# Altium footprint library PcbLib1.PcbLib: 102 footprints (part 2 of 7)
Each footprint in its own frame and in the unit in brackets; x right, y up, seen from the top. Pads: shape width x height; smd on the part's side, far side on the other; paste and mask are expansions set on the pad; w line width, h text height; cw(c..) or ccw(c..) is an arc to the next point about the centre after c.
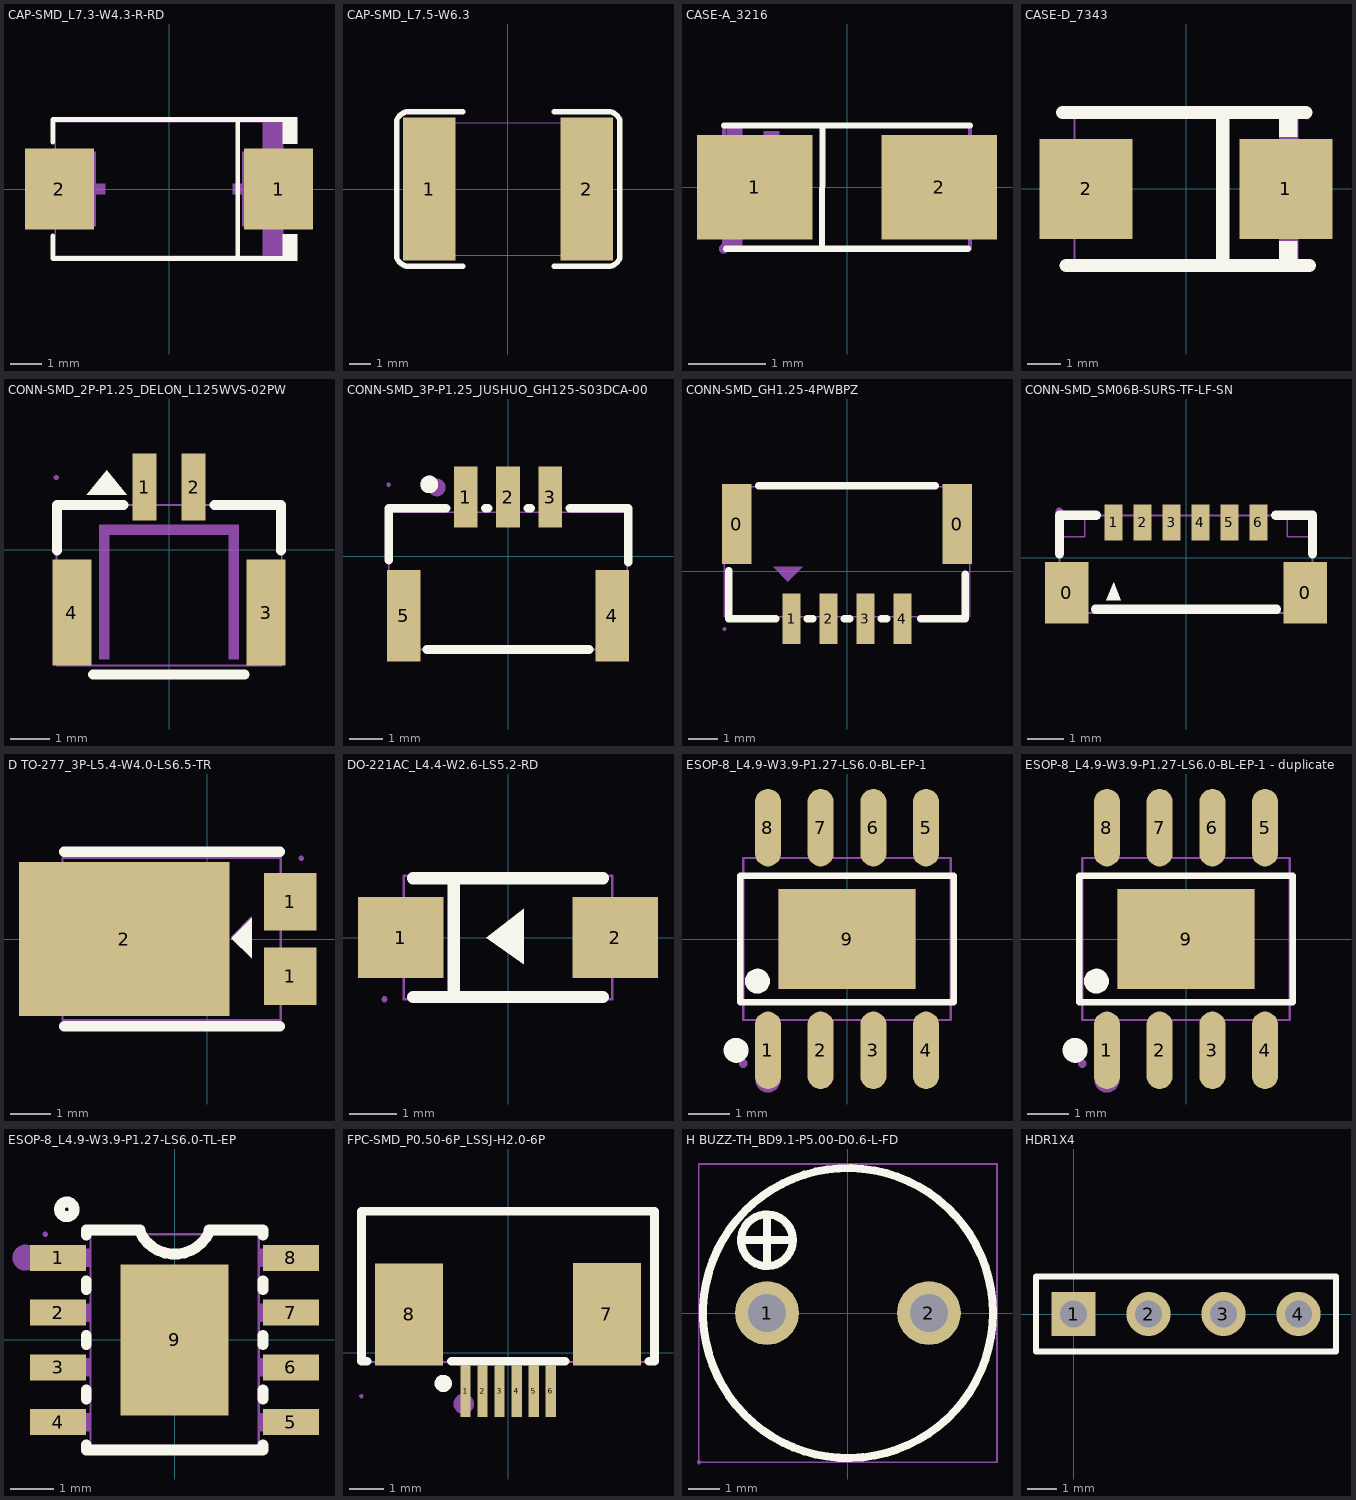
[diagram p1: the footprints below, top view; thin cyan lines are the x and y axes]

## CAP-SMD_L7.3-W4.3-R-RD [mm] "10uF ±10% 50V 坦电容"
pads (2):
  rect 2.207x2.592 smd: 1(3.511,0) 2(-3.511,0)
Top Overlay:
  region: 3.65,-2.302 3.65,-1.448 4.107,-1.448 4.107,-2.302
  region: 3.65,2.302 3.65,1.448 4.107,1.448 4.107,2.302
  lines w0.152: -3.726,-1.499 -3.726,-2.226 3.726,-2.226 ; -3.726,1.499 -3.726,2.226 3.726,2.226 ; 2.204,-2.226 2.204,2.226
Mechanical 6:
  region: 3.65,2.15 3.65,1.075 3.005,1.075 3.005,2.15
  region: 3.65,-2.15 3.65,-1.075 3.005,-1.075 3.005,-2.15
  region: 2.844,-1.075 2.844,1.075 2.521,1.075 2.521,-1.075
  region: 3.328,-0.161 3.328,0.161 2.038,0.161 2.038,-0.161
  region: -3.328,-0.161 -3.328,0.161 -2.038,0.161 -2.038,-0.161
Mechanical 15:
  region: 3.71,-2.12 3.71,-2.095 3.675,-2.06 3.625,-2.06 3.59,-2.095 3.59,-2.12 3.59,-2.145 3.625,-2.18 3.675,-2.18 3.71,-2.145
  region: 3.65,-1.2 3.65,1.2 2.35,1.2 2.35,-1.2
  region: -3.65,-1.2 -3.65,1.2 -2.35,1.2 -2.35,-1.2
  lines w0.051: -3.65,-2.15 3.65,-2.15 3.65,2.15 -3.65,2.15 -3.65,-2.15
3D body "CASE-D_7343666.STEP": height 4.21, standoff -0.04, extent -3.65,-2.15 3.65,2.15

## CAP-SMD_L7.5-W6.3 [mm] "22uF ±20% 50V"
pads (2):
  rect 2.5x6.8 smd: 1(-3.75,0) 2(3.75,0)
Top Overlay:
  lines w0.254: -2.159,-3.683 -4.826,-3.683 cw(c-4.699,-3.048) -5.3,-3.289 -5.3,3.289 cw(c-4.699,3.048) -4.826,3.683 -2.159,3.683 ; 2.193,-3.683 4.86,-3.683 ccw(c4.733,-3.048) 5.334,-3.289 5.334,3.289 ccw(c4.733,3.048) 4.86,3.683 2.193,3.683
Mechanical 15:
  region: 3.15,3.15 3.75,3.15 3.75,-3.15 3.15,-3.15
  region: -3.75,3.15 -3.15,3.15 -3.15,-3.15 -3.75,-3.15
  region: -3.69,-3.15 -3.69,-3.125 -3.725,-3.09 -3.775,-3.09 -3.81,-3.125 -3.81,-3.15 -3.81,-3.175 -3.775,-3.21 -3.725,-3.21 -3.69,-3.175
  lines w0.051: -3.75,-3.15 3.75,-3.15 3.75,3.15 -3.75,3.15 -3.75,-3.15

## CASE-A_3216 [mm]
pads (2):
  rect 1.5x1.359 smd: 1(-1.2,0) 2(1.2,0)
Top Overlay:
  lines w0.08: -1.6,0.8 1.6,0.8 ; -1.575,-0.8 1.575,-0.8 ; -0.323,-0.8 -0.32,0.8
Mechanical 6:
  region: -1.081,0.724 -0.878,0.724 -0.878,-0.673 -1.081,-0.673
  region: -0.61,0.13 -0.61,-0.08 -1.45,-0.08 -1.45,0.13
  region: -1.363,-0.813 -1.567,-0.813 -1.567,-0.483 -1.363,-0.483
  region: -1.563,0.813 -1.36,0.813 -1.36,0.483 -1.563,0.483
  region: 1.501,0.13 1.501,-0.08 0.661,-0.08 0.661,0.13
Mechanical 15:
  region: 1.6,0.625 1.6,-0.575 0.8,-0.575 0.8,0.625
  region: -0.8,0.625 -0.8,-0.575 -1.6,-0.575 -1.6,0.625
  region: -1.54,-0.8 -1.54,-0.775 -1.575,-0.74 -1.625,-0.74 -1.66,-0.775 -1.66,-0.8 -1.66,-0.825 -1.625,-0.86 -1.575,-0.86 -1.54,-0.825
  lines w0.051: -1.6,-0.8 -1.6,0.8 1.6,0.8 1.6,-0.8 -1.6,-0.8
3D body "CASE-A-3216.STEP": height 1.69, standoff -0.01, extent -1.6,-0.8 1.6,0.8

## CASE-D_7343 [mm] "10uf坦电容"
pads (2):
  rect 2.799x3.01 smd: 1(3,0) 2(-3,0)
Top Overlay:
  region: 2.798,2.3 2.798,1.565 3.348,1.565 3.348,2.285 3.333,2.3 3.178,2.3
  region: 3.348,-2.3 3.348,-1.565 2.798,-1.565 2.798,-2.285 2.813,-2.3 2.968,-2.3
  lines w0.4: -3.7,2.3 3.6,2.3 ; -3.6,-2.3 3.7,-2.3 ; 1.1,-2.3 1.101,2.3
Mechanical 6:
  region: -3.6,0.2 -1.9,0.2 -1.9,-0.2 -3.6,-0.2
  region: 1.766,0.245 3.466,0.245 3.466,-0.155 1.766,-0.155
  region: 2.8,0.85 2.8,-0.85 2.4,-0.85 2.4,0.85
  region: 2.8,2.15 2.8,1.205 3.35,1.205 3.35,2.15
  region: 3.35,-2.15 3.35,-1.205 2.8,-1.205 2.8,-2.15
Mechanical 15:
  region: -2.35,-1.2 -3.65,-1.2 -3.65,1.2 -2.35,1.2
  region: 3.65,-1.2 2.35,-1.2 2.35,1.2 3.65,1.2
  region: 3.71,2.15 3.71,2.175 3.675,2.21 3.625,2.21 3.59,2.175 3.59,2.15 3.59,2.125 3.625,2.09 3.675,2.09 3.71,2.125
  lines w0.051: -3.35,-2.15 -3.35,2.15 3.35,2.15 3.35,-2.15 -3.35,-2.15
3D body "CASE-D_7343666.STEP": height 4.21, standoff -0.04, extent -3.655,-2.137 3.645,2.163

## CONN-SMD_2P-P1.25_DELON_L125WVS-02PW [mm]
pads (4):
  rect 0.6x1.7 smd paste+0 mask+0.05: 1(-0.625,1.6) 2(0.625,1.6)
  rect 1x2.7 smd paste+0 mask+0.05: 3(2.475,-1.6) 4(-2.475,-1.6)
Top Overlay:
  region: -1.584,2.032 -2.092,1.397 -1.076,1.397
  lines w0.254: -2.854,-0.019 -2.854,1.143 -1.156,1.143 ; -1.932,-3.175 1.932,-3.175 ; 1.156,1.143 2.854,1.143 2.854,-0.019
Mechanical 6:
  region: 1.524,0.635 -1.524,0.635 -1.524,0.381 1.524,0.381
  region: 1.778,-2.794 1.778,0.635 1.524,0.635 1.524,-2.794
  region: -1.778,-2.794 -1.778,0.635 -1.524,0.635 -1.524,-2.794
Mechanical 15:
  region: 2.365,-0.6 2.585,-0.6 2.585,-2.6 2.365,-2.6
  region: -2.585,-0.6 -2.365,-0.6 -2.365,-2.6 -2.585,-2.6
  region: 0.525,1.843 0.725,1.843 0.725,1.043 0.525,1.043
  region: -0.725,1.843 -0.525,1.843 -0.525,1.043 -0.725,1.043
  region: -2.815,1.843 -2.815,1.868 -2.85,1.903 -2.9,1.903 -2.935,1.868 -2.935,1.843 -2.935,1.818 -2.9,1.783 -2.85,1.783 -2.815,1.818
  lines w0.051: -2.875,-2.957 2.875,-2.957 2.875,1.143 -2.875,1.143 -2.875,-2.957
3D body "SMD,P=1.25mm1.STEP": height 4.29, standoff -0.07, extent -2.875,-3.034 2.875,1.966

## CONN-SMD_3P-P1.25_JUSHUO_GH125-S03DCA-00 [mm]
pads (5):
  rect 0.7x1.8 smd paste+0 mask+0.05: 1(-1.25,1.75) 2(0,1.75) 3(1.25,1.75)
  rect 1x2.7 smd paste+0 mask+0.05: 4(3.08,-1.75) 5(-3.08,-1.75)
Top Overlay:
  circle w0.26: c-2.325,2.125 r0.13
  lines w0.254: -3.525,-0.119 -3.525,1.425 -1.831,1.425 ; -2.4,-2.75 2.4,-2.75 ; -0.669,1.425 -0.581,1.425 ; 0.581,1.425 0.669,1.425 ; 1.831,1.425 3.556,1.425 3.556,-0.169
Mechanical 6:
  circle w0.26: c-2.325,2.125 r0.13
  circle w0.26: c-2.105,2.035 r0.13
Mechanical 15:
  region: -3.465,2.12 -3.465,2.145 -3.5,2.18 -3.55,2.18 -3.585,2.145 -3.585,2.12 -3.585,2.095 -3.55,2.06 -3.5,2.06 -3.465,2.095
  region: 1.15,2.12 1.35,2.12 1.35,1.12 1.15,1.12
  region: -0.1,2.12 0.1,2.12 0.1,1.12 -0.1,1.12
  region: -1.35,2.12 -1.15,2.12 -1.15,1.12 -1.35,1.12
  region: 2.98,-0.83 3.18,-0.83 3.18,-2.67 2.98,-2.67
  region: -3.18,-0.83 -2.98,-0.83 -2.98,-2.67 -3.18,-2.67
  lines w0.051: -3.525,-2.75 -3.525,1.3 3.525,1.3 3.525,-2.75 -3.525,-2.75
3D body "SMD,P=1.25mm.STEP": height 4.29, standoff 0.04, extent -3.525,-2.425 3.526,2.425

## CONN-SMD_GH1.25-4PWBPZ [mm]
pads (6):
  rect 1x2.7 smd paste+0 mask+0.05: 0(-3.725,1.601) 0(3.725,1.601)
  rect 0.6x1.7 smd paste+0 mask+0.05: 1(-1.875,-1.601) 2(-0.625,-1.601) 3(0.625,-1.601) 4(1.875,-1.601)
Top Overlay:
  lines w0.254: -4,0.02 -4,-1.601 -2.5,-1.601 -2.406,-1.601 ; -2.994,2.899 2.994,2.899 ; -1.344,-1.601 -1.156,-1.601 ; -0.094,-1.601 0.094,-1.601 ; 1.156,-1.601 1.344,-1.601 ; 2.5,-1.601 4,-1.601 4,-0.101
Mechanical 6:
  region: -1.5,0.149 -2.5,0.149 -2,-0.351
Mechanical 15:
  region: 3.625,2.851 3.825,2.851 3.825,0.351 3.625,0.351
  region: -3.825,2.851 -3.625,2.851 -3.625,0.351 -3.825,0.351
  region: 1.775,-0.943 1.975,-0.943 1.975,-1.943 1.775,-1.943
  region: 0.525,-0.943 0.725,-0.943 0.725,-1.943 0.525,-1.943
  region: -0.725,-0.943 -0.525,-0.943 -0.525,-1.943 -0.725,-1.943
  region: -1.975,-0.943 -1.775,-0.943 -1.775,-1.943 -1.975,-1.943
  region: -4.09,-1.943 -4.09,-1.918 -4.125,-1.883 -4.175,-1.883 -4.21,-1.918 -4.21,-1.943 -4.21,-1.968 -4.175,-2.003 -4.125,-2.003 -4.09,-1.968
  lines w0.051: -4.15,-1.537 4.15,-1.537 4.15,2.863 -4.15,2.863 -4.15,-1.537
3D body "-.STEP": height 4.25, standoff -0.01, extent -4.096,-1.94 4.155,2.92

## CONN-SMD_SM06B-SURS-TF-LF-SN [mm]
pads (8):
  rect 1.2x1.7 smd: 0(-3.3,-0.975) 0(3.3,-0.975)
  rect 0.5x1 smd: 1(-2,0.975) 2(-1.2,0.975) 3(-0.4,0.975) 4(0.4,0.975) 5(1.2,0.975) 6(2,0.975)
Top Overlay:
  region: -2.2,-1.175 -1.8,-1.175 -2,-0.675
  lines w0.254: -3.5,0.106 -3.5,1.175 -2.481,1.175 ; -2.5,-1.425 2.5,-1.425 ; 2.481,1.175 3.5,1.175 3.5,0.106
Mechanical 15:
  region: -3.4,1.275 -3.4,1.316 -3.459,1.375 -3.541,1.375 -3.6,1.316 -3.6,1.275 -3.6,1.234 -3.541,1.175 -3.459,1.175 -3.4,1.234
  region: 1.9,1.275 2.1,1.275 2.1,0.675 1.9,0.675
  region: 1.1,1.275 1.3,1.275 1.3,0.675 1.1,0.675
  region: 0.3,1.275 0.5,1.275 0.5,0.675 0.3,0.675
  region: -0.5,1.275 -0.3,1.275 -0.3,0.675 -0.5,0.675
  region: -1.3,1.275 -1.1,1.275 -1.1,0.675 -1.3,0.675
  region: -2.1,1.275 -1.9,1.275 -1.9,0.675 -2.1,0.675
  region: 3.3,-0.53 3.5,-0.53 3.5,-1.53 3.3,-1.53
  region: -3.3,-1.53 -3.5,-1.53 -3.5,-0.53 -3.3,-0.53
  lines w0.051: -3.5,-1.53 3.5,-1.53 3.5,0.58 2.8,0.58 2.8,1.17 -2.8,1.17 -2.8,0.58 -3.5,0.58 -3.5,-1.53

## D TO-277_3P-L5.4-W4.0-LS6.5-TR [mm]
pads (3):
  rect 1.29x1.422 smd mask+0.051: 1(2.054,-0.92) 1(2.054,0.92)
  rect 5.2x3.8 smd mask+0.051: 2(-2.054,0)
Top Overlay:
  region: 0.599,0.02 1.099,0.52 1.099,-0.48
  lines w0.254: -3.537,-2.159 1.797,-2.159 ; -3.537,2.159 1.797,2.159
Mechanical 6:
  region: 0.589,0.06 1.089,0.56 1.089,-0.44
Mechanical 15:
  region: 2.387,2 2.387,2.025 2.352,2.06 2.302,2.06 2.267,2.025 2.267,2 2.267,1.975 2.302,1.94 2.352,1.94 2.387,1.975 2.387,2
  region: -3.401,-0.86 -4.221,-0.86 -4.221,0.94 -3.401,0.94 -3.401,1.6 0.179,1.6 0.179,-1.48 -3.401,-1.48
  region: 1.777,-0.47 2.327,-0.47 2.327,-1.37 1.777,-1.37
  region: 1.777,1.37 2.327,1.37 2.327,0.47 1.777,0.47
  lines w0.051: -3.581,-2 -3.581,2 1.819,2 1.819,-2 -3.581,-2
3D body "TO-277B.STEP": height 1.2, standoff 0, extent -4.445,-2.375 2.305,2.375

## DO-221AC_L4.4-W2.6-LS5.2-RD [mm]
pads (2):
  rect 1.8x1.7 smd: 1(-2.26,0) 2(2.26,0)
Top Overlay:
  region: -0.457,0 0.33,0.61 0.33,-0.559
  lines w0.254: -1.999,-1.25 1.999,-1.25 ; -1.999,1.25 1.999,1.25 ; -1.143,-1.245 -1.143,1.245
Mechanical 6:
  region: -2.667,0.152 -1.803,0.152 -1.803,-0.102 -2.667,-0.102
  region: 1.853,0.152 2.717,0.152 2.717,-0.102 1.853,-0.102
  region: 2.184,0.584 2.464,0.584 2.464,-0.635 2.184,-0.635
Mechanical 15:
  region: 1.46,0.725 2.6,0.725 2.6,-0.725 1.46,-0.725
  region: -1.46,-0.725 -2.6,-0.725 -2.6,0.725 -1.46,0.725
  region: -2.54,-1.3 -2.54,-1.275 -2.575,-1.24 -2.625,-1.24 -2.66,-1.275 -2.66,-1.3 -2.66,-1.325 -2.625,-1.36 -2.575,-1.36 -2.54,-1.325 -2.54,-1.3
  lines w0.051: -2.2,-1.3 2.2,-1.3 2.2,1.3 -2.2,1.3 -2.2,-1.3
3D body "DO-221AC214.STEP": height 0.95, standoff 0, extent -2.6,-1.3 2.6,1.3

## ESOP-8_L4.9-W3.9-P1.27-LS6.0-BL-EP-1 [mm]
pads (9):
  oval 0.63x1.865 smd: 1(-1.905,-2.682) 2(-0.635,-2.682) 3(0.635,-2.682) 4(1.905,-2.682) 5(1.905,2.682) 6(0.635,2.682) 7(-0.635,2.682) 8(-1.905,2.682)
  rect 3.3x2.4 smd paste+0 mask+0.05: 9(0,0)
Top Overlay:
  circle w0.3: c-2.672,-2.682 r0.15
  circle w0.3: c-2.159,-1.016 r0.15
  lines w0.152: -2.576,-1.521 -2.576,1.521 2.576,1.521 2.576,-1.521 -2.576,-1.521
Mechanical 6:
  circle w0.3: c-1.905,-3.4 r0.15
Mechanical 15:
  region: -2.4,-3 -2.4,-2.959 -2.458,-2.9 -2.541,-2.9 -2.6,-2.959 -2.6,-3 -2.6,-3.041 -2.541,-3.1 -2.458,-3.1 -2.4,-3.041 -2.4,-3
  region: -2.115,-3 -2.115,-2.165 -1.695,-2.165 -1.695,-3
  region: -2.115,-2.175 -2.115,-1.94 -1.695,-1.94 -1.695,-2.175
  region: -0.845,-3 -0.845,-2.165 -0.425,-2.165 -0.425,-3
  region: -0.845,-2.175 -0.845,-1.94 -0.425,-1.94 -0.425,-2.175
  region: 0.425,-3 0.425,-2.165 0.845,-2.165 0.845,-3
  region: 0.425,-2.175 0.425,-1.94 0.845,-1.94 0.845,-2.175
  region: 1.695,-3 1.695,-2.165 2.115,-2.165 2.115,-3
  region: 1.695,-2.175 1.695,-1.94 2.115,-1.94 2.115,-2.175
  region: -2.115,2.165 -2.115,3 -1.695,3 -1.695,2.165
  region: -2.115,1.94 -2.115,2.175 -1.695,2.175 -1.695,1.94
  region: -0.845,2.165 -0.845,3 -0.425,3 -0.425,2.165
  region: -0.845,1.94 -0.845,2.175 -0.425,2.175 -0.425,1.94
  region: 0.425,2.165 0.425,3 0.845,3 0.845,2.165
  region: 0.425,1.94 0.425,2.175 0.845,2.175 0.845,1.94
  region: 1.695,2.165 1.695,3 2.115,3 2.115,2.165
  region: 1.695,1.94 1.695,2.175 2.115,2.175 2.115,1.94
  region: -1.65,1.2 1.65,1.2 1.65,-1.2 -1.65,-1.2
  lines w0.051: -2.5,-1.95 -2.5,1.95 2.5,1.95 2.5,-1.95 -2.5,-1.95
3D body "PowerSOIC-8214.STEP": height 1.46, standoff -0.04, extent -2.45,-3 2.45,3

## ESOP-8_L4.9-W3.9-P1.27-LS6.0-BL-EP-1 - duplicate [mm]
pads (9):
  oval 0.63x1.865 smd: 1(-1.905,-2.682) 2(-0.635,-2.682) 3(0.635,-2.682) 4(1.905,-2.682) 5(1.905,2.682) 6(0.635,2.682) 7(-0.635,2.682) 8(-1.905,2.682)
  rect 3.3x2.4 smd paste+0 mask+0.05: 9(0,0)
Top Overlay:
  circle w0.3: c-2.159,-1.016 r0.15
  circle w0.3: c-2.672,-2.682 r0.15
  lines w0.152: -2.576,-1.521 2.576,-1.521 2.576,1.521 -2.576,1.521 -2.576,-1.521
Mechanical 6:
  circle w0.3: c-1.905,-3.4 r0.15
Mechanical 15:
  region: -1.65,1.2 1.65,1.2 1.65,-1.2 -1.65,-1.2
  region: 1.695,1.94 1.695,2.175 2.115,2.175 2.115,1.94
  region: 1.695,2.165 1.695,3 2.115,3 2.115,2.165
  region: 0.425,1.94 0.425,2.175 0.845,2.175 0.845,1.94
  region: 0.425,2.165 0.425,3 0.845,3 0.845,2.165
  region: -0.845,1.94 -0.845,2.175 -0.425,2.175 -0.425,1.94
  region: -0.845,2.165 -0.845,3 -0.425,3 -0.425,2.165
  region: -2.115,1.94 -2.115,2.175 -1.695,2.175 -1.695,1.94
  region: -2.115,2.165 -2.115,3 -1.695,3 -1.695,2.165
  region: 1.695,-2.175 1.695,-1.94 2.115,-1.94 2.115,-2.175
  region: 1.695,-3 1.695,-2.165 2.115,-2.165 2.115,-3
  region: 0.425,-2.175 0.425,-1.94 0.845,-1.94 0.845,-2.175
  region: 0.425,-3 0.425,-2.165 0.845,-2.165 0.845,-3
  region: -0.845,-2.175 -0.845,-1.94 -0.425,-1.94 -0.425,-2.175
  region: -0.845,-3 -0.845,-2.165 -0.425,-2.165 -0.425,-3
  region: -2.115,-2.175 -2.115,-1.94 -1.695,-1.94 -1.695,-2.175
  region: -2.115,-3 -2.115,-2.165 -1.695,-2.165 -1.695,-3
  region: -2.4,-3 -2.4,-2.959 -2.458,-2.9 -2.541,-2.9 -2.6,-2.959 -2.6,-3 -2.6,-3.041 -2.541,-3.1 -2.458,-3.1 -2.4,-3.041 -2.4,-3
  lines w0.051: -2.5,-1.95 2.5,-1.95 2.5,1.95 -2.5,1.95 -2.5,-1.95
3D body "PowerSOIC-8214.STEP": height 1.46, standoff -0.04, extent -2.45,-3 2.45,3

## ESOP-8_L4.9-W3.9-P1.27-LS6.0-TL-EP [mm]
pads (9):
  rect 1.3x0.6 smd: 1(-2.7,1.905) 2(-2.7,0.635) 3(-2.7,-0.635) 4(-2.7,-1.905) 5(2.7,-1.905) 6(2.7,-0.635) 7(2.7,0.635) 8(2.7,1.905)
  rect 2.5x3.5 smd: 9(0,0)
Top Overlay:
  circle w0.254: c-2.5,3.03 r0.17
  lines w0.254: -2.05,-2.436 -2.05,-2.55 2.05,-2.55 2.05,-2.436 ; -2.05,-1.374 -2.05,-1.166 ; -2.05,-0.104 -2.05,0.104 ; -2.05,1.166 -2.05,1.374 ; -2.05,2.436 -2.05,2.55 -0.8,2.55 ; -0.8,2.5 ccw(c0,2.875) 0.8,2.5 ; 0.8,2.55 2.05,2.55 2.05,2.436 ; 2.05,-1.374 2.05,-1.166 ; 2.05,-0.104 2.05,0.104 ; 2.05,1.166 2.05,1.374
Mechanical 6:
  circle w0.3: c-3.46,1.91 r0.15
Mechanical 15:
  region: -2.94,2.45 -2.94,2.475 -2.975,2.51 -3.025,2.51 -3.06,2.475 -3.06,2.45 -3.06,2.425 -3.025,2.39 -2.975,2.39 -2.94,2.425 -2.94,2.45
  region: 1.94,2.115 2.175,2.115 2.175,1.695 1.94,1.695
  region: 2.165,2.115 3,2.115 3,1.695 2.165,1.695
  region: 1.94,0.845 2.175,0.845 2.175,0.425 1.94,0.425
  region: 2.165,0.845 3,0.845 3,0.425 2.165,0.425
  region: 1.94,-0.425 2.175,-0.425 2.175,-0.845 1.94,-0.845
  region: 2.165,-0.425 3,-0.425 3,-0.845 2.165,-0.845
  region: 1.94,-1.695 2.175,-1.695 2.175,-2.115 1.94,-2.115
  region: 2.165,-1.695 3,-1.695 3,-2.115 2.165,-2.115
  region: -2.175,-1.695 -1.94,-1.695 -1.94,-2.115 -2.175,-2.115
  region: -3,-1.695 -2.165,-1.695 -2.165,-2.115 -3,-2.115
  region: -2.175,-0.425 -1.94,-0.425 -1.94,-0.845 -2.175,-0.845
  region: -3,-0.425 -2.165,-0.425 -2.165,-0.845 -3,-0.845
  region: -2.175,0.845 -1.94,0.845 -1.94,0.425 -2.175,0.425
  region: -3,0.845 -2.165,0.845 -2.165,0.425 -3,0.425
  region: -2.175,2.115 -1.94,2.115 -1.94,1.695 -2.175,1.695
  region: -3,2.115 -2.165,2.115 -2.165,1.695 -3,1.695
  region: -1.206,-1.65 -1.206,1.65 1.206,1.65 1.206,-1.65
  lines w0.051: -1.95,-2.45 1.95,-2.45 1.95,2.45 -1.95,2.45 -1.95,-2.45
3D body "SO-8214.STEP": height 1.49, standoff -0.06, extent -3,-2.45 3,2.45

## FPC-SMD_P0.50-6P_LSSJ-H2.0-6P [mm]
pads (8):
  rect 0.3x1.5 smd: 1(-1.245,-1.13) 2(-0.745,-1.13) 3(-0.245,-1.13) 4(0.255,-1.13) 5(0.755,-1.13) 6(1.255,-1.13)
  rect 2x3 smd: 7(2.901,1.13) 8(-2.901,1.124)
Top Overlay:
  circle w0.254: c-1.9,-0.9 r0.127
  lines w0.254: -4.133,-0.246 -4.3,-0.246 -4.3,4.154 4.3,4.154 4.3,-0.246 4.132,-0.246 ; -1.669,-0.246 1.671,-0.246
Mechanical 6:
  circle w0.3: c-1.3,-1.5 r0.15
Mechanical 15:
  region: 1.95,2.356 3.75,2.356 3.75,-0.265 1.95,-0.265
  region: -3.751,2.35 -1.951,2.35 -1.951,-0.271 -3.751,-0.271
  region: -1.345,-0.221 -1.145,-0.221 -1.145,-1.271 -1.345,-1.271
  region: -0.845,-0.221 -0.645,-0.221 -0.645,-1.271 -0.845,-1.271
  region: -0.345,-0.221 -0.145,-0.221 -0.145,-1.271 -0.345,-1.271
  region: 0.155,-0.221 0.355,-0.221 0.355,-1.271 0.155,-1.271
  region: 0.655,-0.221 0.855,-0.221 0.855,-1.271 0.655,-1.271
  region: 1.155,-0.221 1.355,-0.221 1.355,-1.271 1.155,-1.271
  region: -4.24,-1.271 -4.24,-1.246 -4.275,-1.211 -4.325,-1.211 -4.36,-1.246 -4.36,-1.271 -4.36,-1.296 -4.325,-1.331 -4.275,-1.331 -4.24,-1.296
  lines w0.051: -4.3,-0.271 4.3,-0.271 4.3,4.129 -4.3,4.129 -4.3,-0.271
3D body "SMD,P=0.5mm.STEP": height 2.01, standoff 0, extent -4.3,-1.717 4.3,3.683

## H BUZZ-TH_BD9.1-P5.00-D0.6-L-FD [mm]
pads (2):
  round 2 hole 1.2 mask+0.051: 1(-2.54,0) 2(2.54,0)
Top Overlay:
  circle w0.254: c0,0 r4.55
  circle w0.254: c-2.54,2.286 r0.813
  lines w0.254: -3.302,2.286 -1.778,2.286 ; -2.54,1.524 -2.54,3.048
Mechanical 15:
  region: -2.04,0 -2.04,0.099 -2.116,0.283 -2.257,0.424 -2.441,0.5 -2.639,0.5 -2.823,0.424 -2.964,0.283 -3.04,0.099 -3.04,0 -3.04,-0.099 -2.964,-0.283 -2.823,-0.424 -2.639,-0.5 -2.441,-0.5 -2.257,-0.424 -2.116,-0.283 -2.04,-0.099 -2.04,0
  region: 3.04,0 3.04,0.099 2.964,0.283 2.823,0.424 2.639,0.5 2.441,0.5 2.257,0.424 2.116,0.283 2.04,0.099 2.04,0 2.04,-0.099 2.116,-0.283 2.257,-0.424 2.441,-0.5 2.639,-0.5 2.823,-0.424 2.964,-0.283 3.04,-0.099 3.04,0
  region: -4.617,-4.677 -4.617,-4.652 -4.652,-4.617 -4.702,-4.617 -4.737,-4.652 -4.737,-4.677 -4.737,-4.702 -4.702,-4.737 -4.652,-4.737 -4.617,-4.702 -4.617,-4.677
  lines w0.051: -4.677,-4.677 4.677,-4.677 4.677,4.677 -4.677,4.677 -4.677,-4.677
3D body "插件,D=9.1mm.STEP": height 4.2, standoff -4.5, extent -4.55,-4.55 4.55,4.55

## HDR1X4 [mm] "Connector; Header; 4 Position"
pads (4):
  rect 1.5x1.5 hole 0.9: 1(0,0)
  round 1.5 hole 0.9: 2(2.54,0) 3(5.08,0) 4(7.62,0)
Top Overlay:
  lines w0.2: -1.27,-1.27 -1.27,1.27 8.89,1.27 8.89,-1.27 -1.27,-1.27